# Altium footprint library pcb_PassiveInd.PcbLib: 58 footprints (part 1 of 4)
Each footprint in its own frame and in the unit in brackets; x right, y up, seen from the top. Pads: shape width x height; smd on the part's side, far side on the other; paste and mask are expansions set on the pad; w line width, h text height; cw(c..) or ccw(c..) is an arc to the next point about the centre after c.
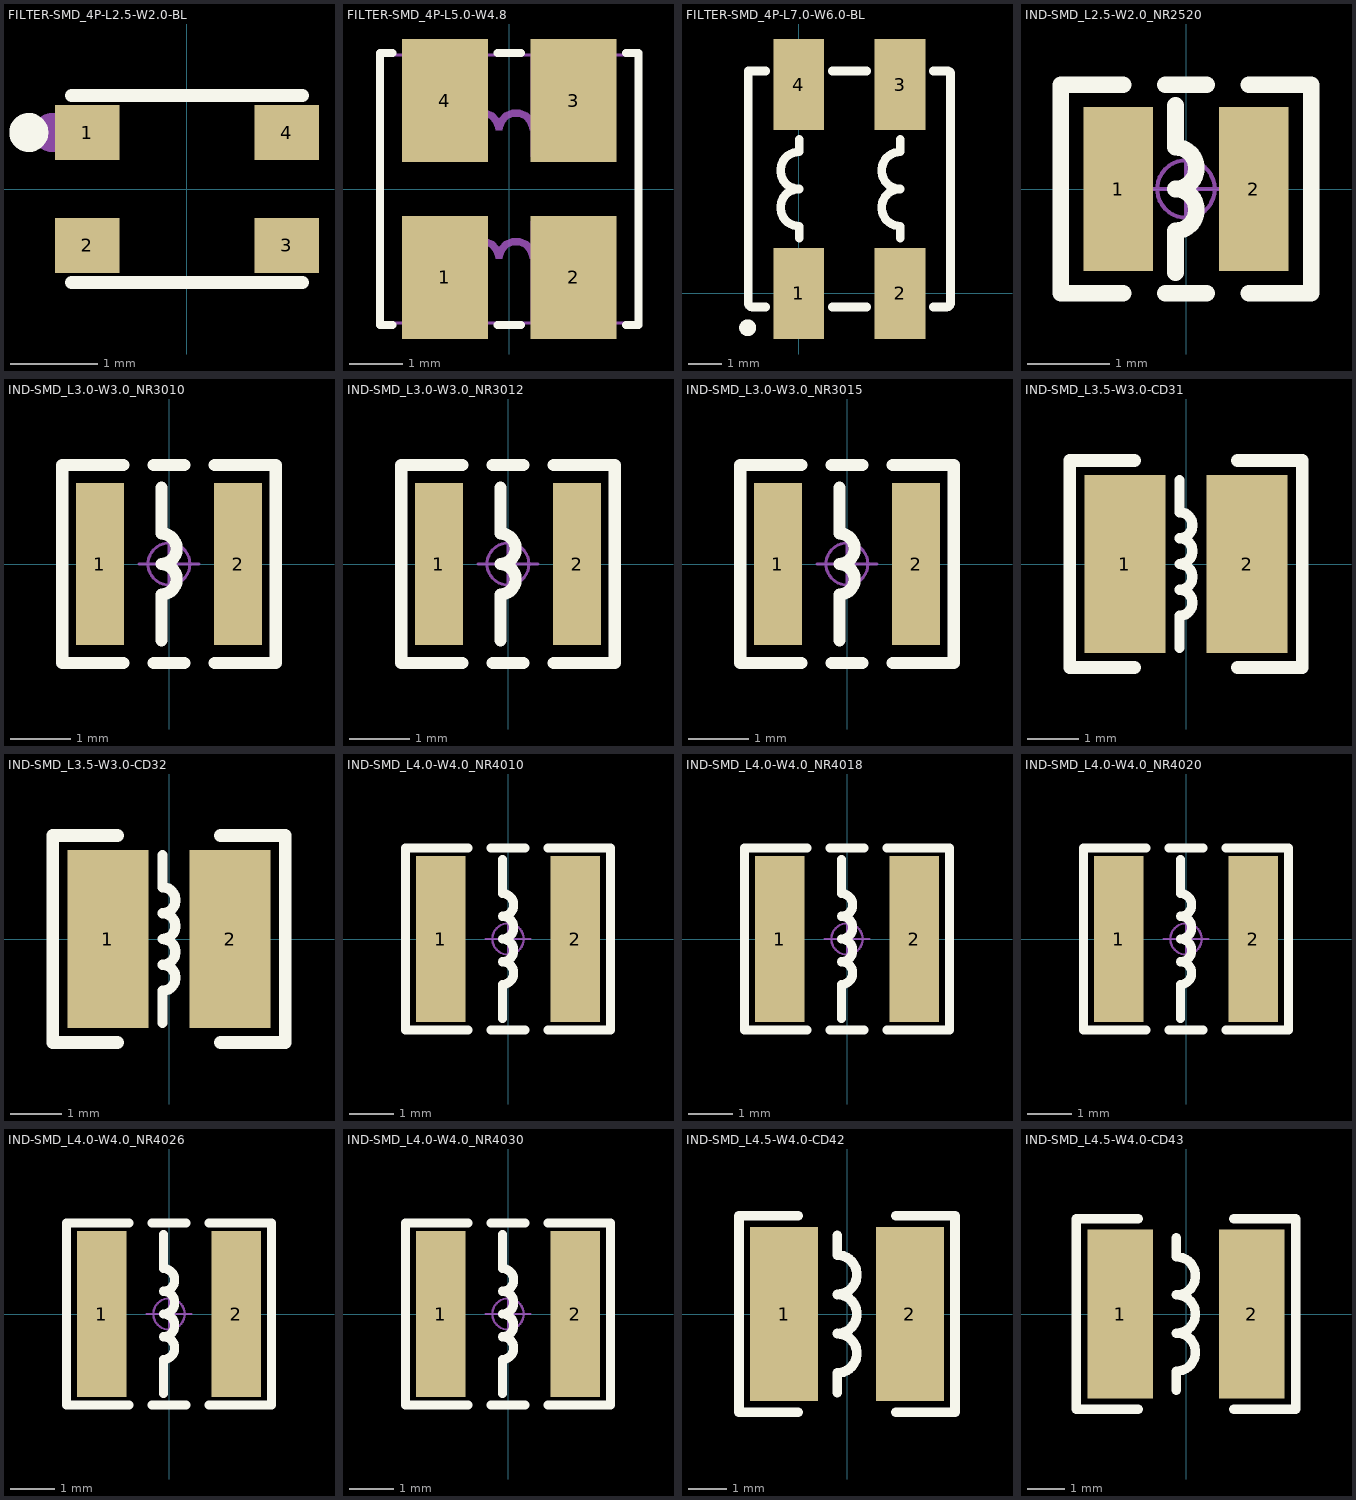
[diagram p0: the footprints below, top view; thin cyan lines are the x and y axes]

## FILTER-SMD_4P-L2.5-W2.0-BL [mm]
height 1.9
pads (4):
  rect 0.745x0.63 smd: 1(-1.147,0.65) 2(-1.147,-0.65) 3(1.147,-0.65) 4(1.147,0.65)
Top Overlay:
  circle w0.225: c-1.82,0.65 r0.113
  lines w0.152: -1.326,-1.076 1.326,-1.076 ; -1.326,1.076 1.326,1.076
Mechanical 15:
  circle w0.225: c-1.55,0.65 r0.113
Mechanical 16:
  text ".Designator" at 0,0 h1
3D body: height 3.1, standoff 3, extent -1.101,0.4 -0.701,0.8
3D body: height 3, standoff 0, extent -1.3,-1.1 1.3,1.1

## FILTER-SMD_4P-L5.0-W4.8 [mm]
pads (4):
  rect 1.6x2.3 smd paste+0 mask+0.05: 1(-1.2,-1.65) 2(1.2,-1.65) 3(1.2,1.65) 4(-1.2,1.65)
Top Overlay:
  lines w0.152: -2.18,-2.54 -2.413,-2.54 -2.413,2.54 -2.18,2.54 ; -0.22,-2.54 0.22,-2.54 ; -0.127,2.54 -0.22,2.54 0.22,2.54 ; 2.18,-2.54 2.413,-2.54 2.413,2.54 2.18,2.54
Mechanical 6:
  drawing of 11 lines, arcs and shapes, not listed
Mechanical 15:
  region: -2.34,-2.5 -2.34,-2.475 -2.375,-2.44 -2.425,-2.44 -2.46,-2.475 -2.46,-2.5 -2.46,-2.525 -2.425,-2.56 -2.375,-2.56 -2.34,-2.525
  region: 0.4,-2.5 1.75,-2.5 1.75,-0.6 0.4,-0.6
  region: 0.4,0.6 1.75,0.6 1.75,2.5 0.4,2.5
  region: -1.75,0.6 -0.4,0.6 -0.4,2.5 -1.75,2.5
  region: -1.75,-2.5 -0.4,-2.5 -0.4,-0.6 -1.75,-0.6
  lines w0.051: -2.4,-2.5 -2.4,2.5 2.4,2.5 2.4,-2.5 -2.4,-2.5
Mechanical 16:
  text ".Designator" at 0,0 h1
3D body: height 2.5, standoff 0, extent -2.413,-2.54 2.413,2.565
3D body: height 2.51, standoff 0, extent -1.689,-1.727 1.689,-1.575
3D body: height 2.51, standoff 0, extent -1.689,1.575 1.689,1.727

## FILTER-SMD_4P-L7.0-W6.0-BL [mm]
pads (4):
  rect 1.501x2.7 smd: 1(0,0) 2(3,0) 3(3,6.2) 4(0,6.2)
Top Overlay:
  circle w0.25: c-1.522,-1.016 r0.125
  lines w0.254: -1.501,-0.288 ccw(c-1.389,-0.288) -1.389,-0.4 -0.98,-0.4 ; -1.501,6.488 cw(c-1.389,6.488) -1.389,6.6 ; -1.498,-0.278 -1.498,1.5 -1.498,4.751 -1.498,6.478 ; -1.498,6.6 -0.98,6.6 ; 0.004,1.64 0.004,2 cw(c0.004,2.55) 0.004,3.1 cw(c0.004,3.65) 0.004,4.2 0.004,4.57 ; 0.984,-0.4 2.016,-0.4 ; 0.984,6.6 2.016,6.6 ; 3.004,1.64 3.004,2 cw(c3.004,2.55) 3.004,3.1 cw(c3.004,3.65) 3.004,4.2 3.004,4.57 ; 3.98,-0.4 4.388,-0.4 ccw(c4.388,-0.288) 4.499,-0.288 ; 3.98,6.6 4.429,6.6 cw(c4.428,6.529) 4.499,6.529 ; 4.497,-0.278 4.497,1.5 4.497,4.751 4.497,6.529
Mechanical 16:
  text ".Designator" at 0,0 h1

## IND-SMD_L2.5-W2.0_NR2520 [mm] "2.5mm*2.0mm*1.0mm(长*宽*高）"
pads (2):
  rect 0.85x2 smd: 1(-0.825,0) 2(0.825,0)
Top Overlay:
  lines w0.203: -0.762,-1.27 -1.524,-1.27 -1.524,1.27 -0.762,1.27 ; -0.254,-1.27 0.254,-1.27 ; -0.254,1.27 0.254,1.27 ; -0.127,-1.016 -0.127,-0.508 ccw(c-0.127,-0.254) -0.127,0 ccw(c-0.127,0.254) -0.127,0.508 -0.127,1.016 ; 0.762,-1.27 1.524,-1.27 1.524,1.27 0.762,1.27
Mechanical 15:
  circle w0.05: c0,0 r0.35
  lines w0.05: -0.5,0 0.5,0 ; 0,-0.5 0,0.5
Mechanical 16:
  text ".Designator" at 0,0 h1
3D body "NR2520.STEP": height 1.1, standoff 0, extent -1.25,-1 1.25,1

## IND-SMD_L3.0-W3.0_NR3010 [mm] "3.0mm*3.0mm*1.0mm(长*宽*高）"
pads (2):
  rect 0.8x2.7 smd: 1(-1.15,0) 2(1.15,0)
Top Overlay:
  lines w0.203: -0.762,-1.651 -1.778,-1.651 -1.778,1.651 -0.762,1.651 ; -0.254,-1.651 0.254,-1.651 ; -0.254,1.651 0.254,1.651 ; -0.127,-1.27 -0.127,-0.508 ccw(c-0.127,-0.254) -0.127,0 ccw(c-0.127,0.254) -0.127,0.508 -0.127,1.27 ; 0.762,-1.651 1.778,-1.651 1.778,1.651 0.762,1.651
Mechanical 15:
  circle w0.05: c0,0 r0.35
  lines w0.05: -0.5,0 0.5,0 ; 0,-0.5 0,0.5
Mechanical 16:
  text ".Designator" at 0,0 h1
3D body "NR3010.STEP": height 1.15, standoff 0, extent -1.5,-1.5 1.5,1.5

## IND-SMD_L3.0-W3.0_NR3012 [mm] "3.0mm*3.0mm*1.2mm(长*宽*高）"
pads (2):
  rect 0.8x2.7 smd: 1(-1.15,0) 2(1.15,0)
Top Overlay:
  lines w0.203: -0.762,-1.651 -1.778,-1.651 -1.778,1.651 -0.762,1.651 ; -0.254,-1.651 0.254,-1.651 ; -0.254,1.651 0.254,1.651 ; -0.127,-1.27 -0.127,-0.508 ccw(c-0.127,-0.254) -0.127,0 ccw(c-0.127,0.254) -0.127,0.508 -0.127,1.27 ; 0.762,-1.651 1.778,-1.651 1.778,1.651 0.762,1.651
Mechanical 15:
  circle w0.05: c0,0 r0.35
  lines w0.05: -0.5,0 0.5,0 ; 0,-0.5 0,0.5
Mechanical 16:
  text ".Designator" at 0,0 h1
3D body "NR3012.STEP": height 1.35, standoff 0.05, extent -1.5,-1.5 1.5,1.5

## IND-SMD_L3.0-W3.0_NR3015 [mm] "3.0mm*3.0mm*1.5mm(长*宽*高）"
pads (2):
  rect 0.8x2.7 smd: 1(-1.15,0) 2(1.15,0)
Top Overlay:
  lines w0.203: -0.762,-1.651 -1.778,-1.651 -1.778,1.651 -0.762,1.651 ; -0.254,-1.651 0.254,-1.651 ; -0.254,1.651 0.254,1.651 ; -0.127,-1.27 -0.127,-0.508 ccw(c-0.127,-0.254) -0.127,0 ccw(c-0.127,0.254) -0.127,0.508 -0.127,1.27 ; 0.762,-1.651 1.778,-1.651 1.778,1.651 0.762,1.651
Mechanical 15:
  circle w0.05: c0,0 r0.35
  lines w0.05: -0.5,0 0.5,0 ; 0,-0.5 0,0.5
Mechanical 16:
  text ".Designator" at 0,0 h1
3D body "NR3015.STEP": height 1.6, standoff 0, extent -1.5,-1.5 1.5,1.5

## IND-SMD_L3.5-W3.0-CD31 [mm] "3.5*3*1mm（长宽高）"
pads (2):
  rect 1.6x3.5 smd: 1(-1.2,0) 2(1.2,0)
Top Overlay:
  lines w0.203: -0.127,-1.651 -0.127,-1.016 ccw(c-0.127,-0.762) -0.127,-0.508 ccw(c-0.127,-0.254) -0.127,0 ccw(c-0.127,0.254) -0.127,0.508 ccw(c-0.127,0.762) -0.127,1.016 -0.127,1.651
  lines w0.254: -1.016,-2.032 -2.286,-2.032 -2.286,2.032 -1.016,2.032 ; 1.016,-2.032 2.286,-2.032 2.286,2.032 1.016,2.032
Mechanical 16:
  text ".Designator" at 0,0 h1
3D body "CD31.STEP": height 1.2, standoff 0, extent -1.718,-1.5 1.718,1.5

## IND-SMD_L3.5-W3.0-CD32 [mm] "3.5*3*2mm（长宽高）"
pads (2):
  rect 1.6x3.5 smd: 1(-1.2,0) 2(1.2,0)
Top Overlay:
  lines w0.203: -0.127,-1.651 -0.127,-1.016 ccw(c-0.127,-0.762) -0.127,-0.508 ccw(c-0.127,-0.254) -0.127,0 ccw(c-0.127,0.254) -0.127,0.508 ccw(c-0.127,0.762) -0.127,1.016 -0.127,1.651
  lines w0.254: -1.016,-2.032 -2.286,-2.032 -2.286,2.032 -1.016,2.032 ; 1.016,-2.032 2.286,-2.032 2.286,2.032 1.016,2.032
Mechanical 16:
  text ".Designator" at 0,0 h1
3D body "CD32.STEP": height 2.15, standoff 0.05, extent -1.707,-1.5 1.707,1.5

## IND-SMD_L4.0-W4.0_NR4010 [mm] "4.0mm*4.0mm*1.0mm(长*宽*高）"
pads (2):
  rect 1.1x3.7 smd: 1(-1.5,0) 2(1.5,0)
Top Overlay:
  lines w0.203: -0.889,-2.032 -2.286,-2.032 -2.286,2.032 -0.889,2.032 ; -0.381,-2.032 0.381,-2.032 ; -0.381,2.032 0.381,2.032 ; -0.127,-1.778 -0.127,-1.016 ccw(c-0.127,-0.762) -0.127,-0.508 ccw(c-0.127,-0.254) -0.127,0 ccw(c-0.127,0.254) -0.127,0.508 ccw(c-0.127,0.762) -0.127,1.016 -0.127,1.778 ; 0.889,-2.032 2.286,-2.032 2.286,2.032 0.889,2.032
Mechanical 15:
  circle w0.05: c0,0 r0.35
  lines w0.05: -0.5,0 0.5,0 ; 0,-0.5 0,0.5
Mechanical 16:
  text ".Designator" at 0,0 h1
3D body "NR4010.STEP": height 1.1, standoff 0, extent -2,-2 2,2

## IND-SMD_L4.0-W4.0_NR4018 [mm] "4.0mm*4.0mm*1.8mm(长*宽*高）"
pads (2):
  rect 1.1x3.7 smd: 1(-1.5,0) 2(1.5,0)
Top Overlay:
  lines w0.203: -0.889,-2.032 -2.286,-2.032 -2.286,2.032 -0.889,2.032 ; -0.381,-2.032 0.381,-2.032 ; -0.381,2.032 0.381,2.032 ; -0.127,-1.778 -0.127,-1.016 ccw(c-0.127,-0.762) -0.127,-0.508 ccw(c-0.127,-0.254) -0.127,0 ccw(c-0.127,0.254) -0.127,0.508 ccw(c-0.127,0.762) -0.127,1.016 -0.127,1.778 ; 0.889,-2.032 2.286,-2.032 2.286,2.032 0.889,2.032
Mechanical 15:
  circle w0.05: c0,0 r0.35
  lines w0.05: -0.5,0 0.5,0 ; 0,-0.5 0,0.5
Mechanical 16:
  text ".Designator" at 0,0 h1
3D body "NR4018.STEP": height 1.9, standoff 0, extent -2,-2 2,2

## IND-SMD_L4.0-W4.0_NR4020 [mm] "4.0mm*4.0mm*2.0mm(长*宽*高）"
pads (2):
  rect 1.1x3.7 smd: 1(-1.5,0) 2(1.5,0)
Top Overlay:
  lines w0.203: -0.889,-2.032 -2.286,-2.032 -2.286,2.032 -0.889,2.032 ; -0.381,-2.032 0.381,-2.032 ; -0.381,2.032 0.381,2.032 ; -0.127,-1.778 -0.127,-1.016 ccw(c-0.127,-0.762) -0.127,-0.508 ccw(c-0.127,-0.254) -0.127,0 ccw(c-0.127,0.254) -0.127,0.508 ccw(c-0.127,0.762) -0.127,1.016 -0.127,1.778 ; 0.889,-2.032 2.286,-2.032 2.286,2.032 0.889,2.032
Mechanical 15:
  circle w0.05: c0,0 r0.35
  lines w0.05: -0.5,0 0.5,0 ; 0,-0.5 0,0.5
Mechanical 16:
  text ".Designator" at 0,0 h1
3D body "NR4020.STEP": height 2.1, standoff 0, extent -2,-2 2,2

## IND-SMD_L4.0-W4.0_NR4026 [mm] "4.0mm*4.0mm*2.6mm(长*宽*高）"
pads (2):
  rect 1.1x3.7 smd: 1(-1.5,0) 2(1.5,0)
Top Overlay:
  lines w0.203: -0.889,-2.032 -2.286,-2.032 -2.286,2.032 -0.889,2.032 ; -0.381,-2.032 0.381,-2.032 ; -0.381,2.032 0.381,2.032 ; -0.127,-1.778 -0.127,-1.016 ccw(c-0.127,-0.762) -0.127,-0.508 ccw(c-0.127,-0.254) -0.127,0 ccw(c-0.127,0.254) -0.127,0.508 ccw(c-0.127,0.762) -0.127,1.016 -0.127,1.778 ; 0.889,-2.032 2.286,-2.032 2.286,2.032 0.889,2.032
Mechanical 15:
  circle w0.05: c0,0 r0.35
  lines w0.05: -0.5,0 0.5,0 ; 0,-0.5 0,0.5
Mechanical 16:
  text ".Designator" at 0,0 h1
3D body "NR4026.STEP": height 2.7, standoff 0, extent -2,-2 2,2

## IND-SMD_L4.0-W4.0_NR4030 [mm] "4.0mm*4.0mm*3.0mm(长*宽*高）"
pads (2):
  rect 1.1x3.7 smd: 1(-1.5,0) 2(1.5,0)
Top Overlay:
  lines w0.203: -0.889,-2.032 -2.286,-2.032 -2.286,2.032 -0.889,2.032 ; -0.381,-2.032 0.381,-2.032 ; -0.381,2.032 0.381,2.032 ; -0.127,-1.778 -0.127,-1.016 ccw(c-0.127,-0.762) -0.127,-0.508 ccw(c-0.127,-0.254) -0.127,0 ccw(c-0.127,0.254) -0.127,0.508 ccw(c-0.127,0.762) -0.127,1.016 -0.127,1.778 ; 0.889,-2.032 2.286,-2.032 2.286,2.032 0.889,2.032
Mechanical 15:
  circle w0.05: c0,0 r0.35
  lines w0.05: -0.5,0 0.5,0 ; 0,-0.5 0,0.5
Mechanical 16:
  text ".Designator" at 0,0 h1
3D body "NR4030.STEP": height 3.1, standoff 0, extent -2,-2 2,2

## IND-SMD_L4.5-W4.0-CD42 [mm] "4.5*4*2mm（长宽高）"
pads (2):
  rect 1.75x4.5 smd: 1(-1.625,0) 2(1.625,0)
Top Overlay:
  lines w0.254: -1.27,-2.54 -2.794,-2.54 -2.794,2.54 -1.27,2.54 ; -0.254,-2.032 -0.254,-1.524 ccw(c-0.254,-1.016) -0.254,-0.508 ccw(c-0.254,0) -0.254,0.508 ccw(c-0.254,1.016) -0.254,1.524 -0.254,2.032 ; 1.27,-2.54 2.794,-2.54 2.794,2.54 1.27,2.54
Mechanical 16:
  text ".Designator" at 0,0 h1
3D body "CD42.STEP": height 2.1, standoff 0, extent -2.21,-2 2.21,2

## IND-SMD_L4.5-W4.0-CD43 [mm] "4.5*4*3.2mm（长宽高）"
pads (2):
  rect 1.75x4.5 smd: 1(-1.75,0) 2(1.75,0)
Top Overlay:
  lines w0.254: -1.27,-2.54 -2.921,-2.54 -2.921,2.54 -1.27,2.54 ; -0.254,-2.032 -0.254,-1.524 ccw(c-0.254,-1.016) -0.254,-0.508 ccw(c-0.254,0) -0.254,0.508 ccw(c-0.254,1.016) -0.254,1.524 -0.254,2.032 ; 1.27,-2.54 2.921,-2.54 2.921,2.54 1.27,2.54
Mechanical 16:
  text ".Designator" at 0,0 h1
3D body "CD43.STEP": height 3.3, standoff 0, extent -2.21,-2 2.21,2